# Altium footprint library Connectors.PcbLib: 69 footprints (part 5 of 5)
Each footprint in its own frame and in the unit in brackets; x right, y up, seen from the top. Pads: shape width x height; smd on the part's side, far side on the other; paste and mask are expansions set on the pad; w line width, h text height; cw(c..) or ccw(c..) is an arc to the next point about the centre after c.
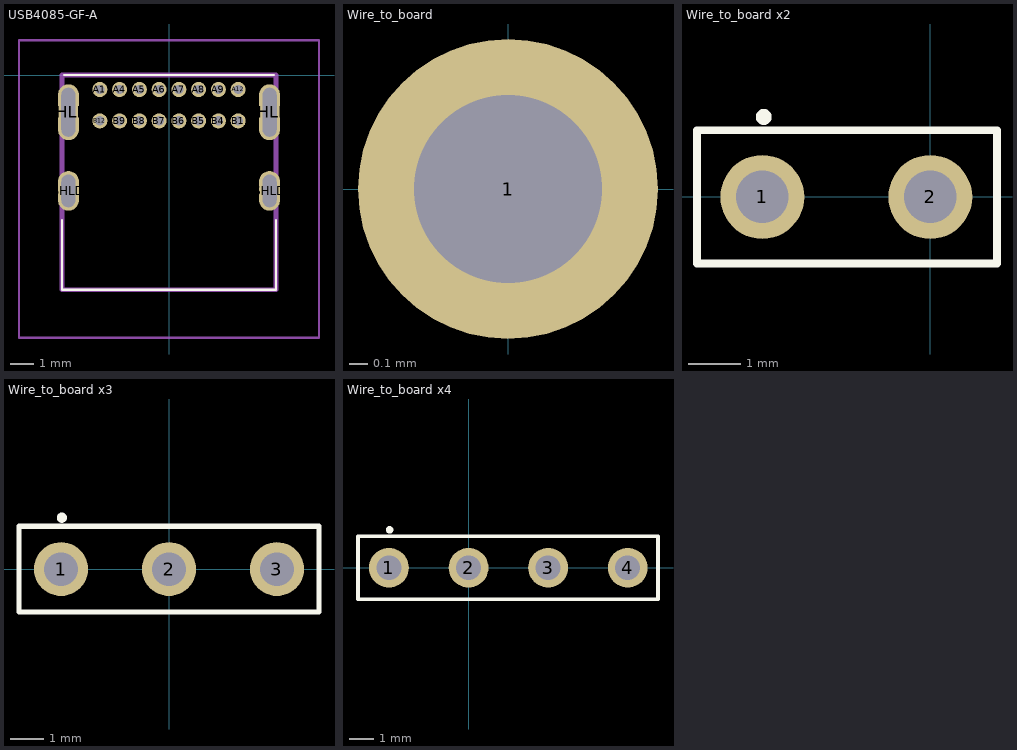
[diagram p4: the footprints below, top view; thin cyan lines are the x and y axes]

## USB4085-GF-A [mm]
pads (20):
  round 0.65 hole 0.4 unplated mask+0: A1(-2.975,-0.62) A4(-2.125,-0.62) A5(-1.275,-0.62) A6(-0.425,-0.62) A7(0.425,-0.62) A8(1.275,-0.62) A9(2.125,-0.62) A12(2.975,-0.62) B1(2.975,-1.97) B4(2.125,-1.97) B5(1.275,-1.97) B6(0.425,-1.97) B7(-0.425,-1.97) B8(-1.275,-1.97) B9(-2.125,-1.97) B12(-2.975,-1.97)
  oval 0.9x1.7 hole 0.6 slot 1.4 at 90 deg unplated mask+0: SHLD(-4.325,-4.98) SHLD(4.325,-4.98)
  oval 0.9x2.4 hole 0.6 slot 2.1 at 90 deg unplated mask+0: SHLD(-4.325,-1.6) SHLD(4.325,-1.6)
Top Overlay:
  lines w0.1: -4.6,-6.23 -4.6,-9.23 4.6,-9.23 4.6,-6.23 ; -4.5,0 4.5,0
Top 3D Body (Mech13):
  lines w0.2: -4.6,-9.23 -4.6,0 4.6,0 4.6,-9.23 -4.6,-9.23
Mechanical 15:
  lines w0.1: -6.45,-11.3 -6.45,1.5 6.45,1.5 6.45,-11.3 -6.45,-11.3
3D body "USB4085-GF-A.stp": height 3.49, standoff -2.07, extent -4.515,-9.23 4.515,-0.06

## Wire_to_board [mm]
pads (1):
  round 1.6 hole 1: 1(0,0)
3D body "Wire_05_FAT.x_t": height 1.48, standoff -13.22, extent -0.798,-0.8 0.799,0.794

## Wire_to_board x2 [mm]
pads (2):
  round 1.6 hole 1: 1(-3.2,0) 2(0,0)
Top Overlay:
  lines w0.15: -4.445,-1.27 1.27,-1.27 1.27,1.27 -4.445,1.27 -4.445,-1.27
  lines w0.2: -3.175,1.474 ccw(c-3.175,1.524) -3.175,1.574 ccw(c-3.175,1.524) -3.175,1.474
3D body "Wire_05_FAT.x_t": height 1.48, standoff -13.22, extent -0.798,-0.8 0.799,0.794
3D body "Wire_05_FAT.x_t": height 1.48, standoff -13.22, extent -3.998,-0.8 -2.401,0.794

## Wire_to_board x3 [mm]
pads (3):
  round 1.6 hole 1: 1(-3.2,0) 2(0,0) 3(3.2,0)
Top Overlay:
  lines w0.15: -4.445,-1.27 4.445,-1.27 4.445,1.27 -4.445,1.27 -4.445,-1.27
  lines w0.2: -3.175,1.474 ccw(c-3.175,1.524) -3.175,1.574 ccw(c-3.175,1.524) -3.175,1.474
3D body "Wire_05_FAT.x_t": height 1.48, standoff -13.22, extent 2.402,-0.8 3.999,0.794
3D body "Wire_05_FAT.x_t": height 1.48, standoff -13.22, extent -0.798,-0.8 0.799,0.794
3D body "Wire_05_FAT.x_t": height 1.48, standoff -13.22, extent -3.998,-0.8 -2.401,0.794

## Wire_to_board x4 [mm]
pads (4):
  round 1.6 hole 1: 1(-3.2,0) 2(0,0) 3(3.2,0) 4(6.4,0)
Top Overlay:
  lines w0.15: -4.445,-1.27 -4.445,1.27 7.62,1.27 7.62,-1.27 -4.445,-1.27
  lines w0.2: -3.175,1.474 cw(c-3.175,1.524) -3.175,1.574 cw(c-3.175,1.524) -3.175,1.474
3D body "Wire_05_FAT.x_t": height 1.48, standoff -13.22, extent 5.602,-0.8 7.199,0.794
3D body "Wire_05_FAT.x_t": height 1.48, standoff -13.22, extent 2.402,-0.8 3.999,0.794
3D body "Wire_05_FAT.x_t": height 1.48, standoff -13.22, extent -0.798,-0.8 0.799,0.794
3D body "Wire_05_FAT.x_t": height 1.48, standoff -13.22, extent -3.998,-0.8 -2.401,0.794